# Altium footprint library PCB_ConnectorHDR.PcbLib: 221 footprints (part 12 of 14)
Each footprint in its own frame and in the unit in brackets; x right, y up, seen from the top. Pads: shape width x height; smd on the part's side, far side on the other; paste and mask are expansions set on the pad; w line width, h text height; cw(c..) or ccw(c..) is an arc to the next point about the centre after c.
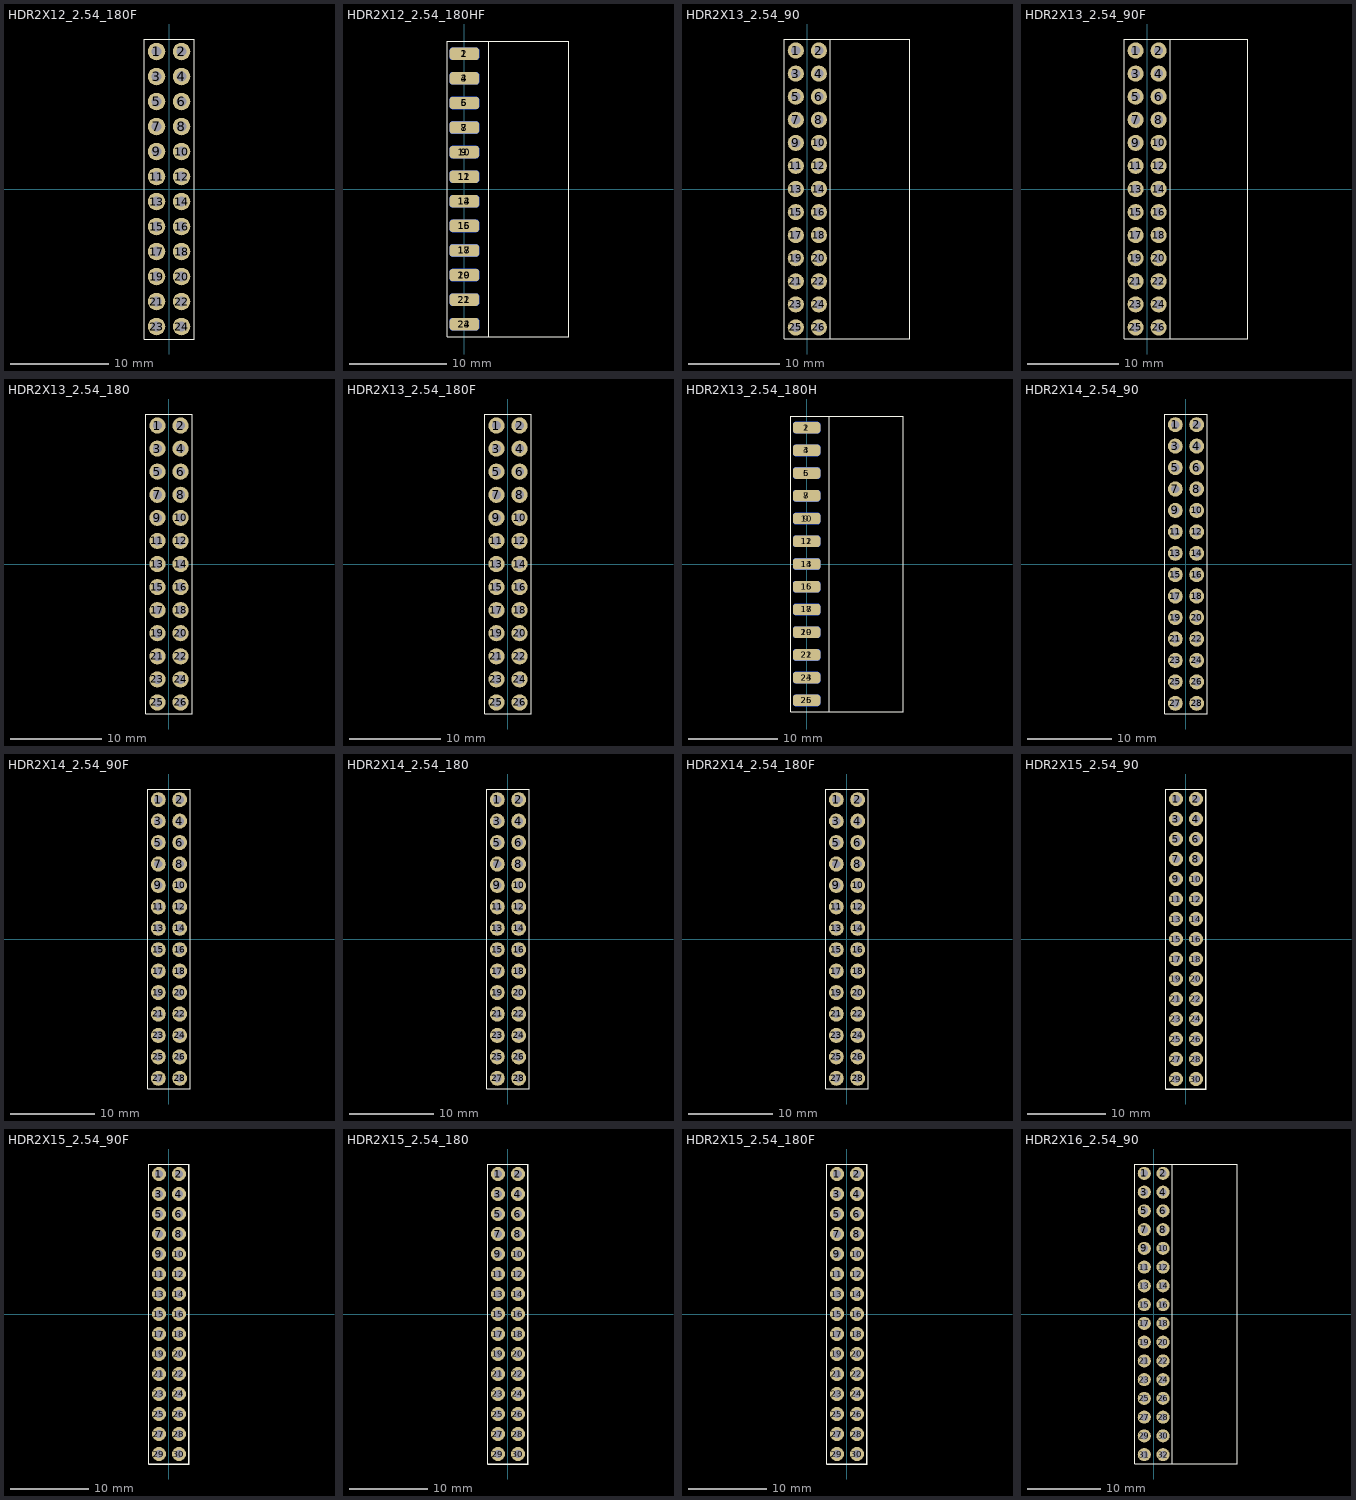
[diagram p11: the footprints below, top view; thin cyan lines are the x and y axes]

## HDR2X12_2.54_180F [mil]
height 169.29
pads (24):
  round 70 hole 39.37: 1(-50,550) 2(50,550) 3(-50,450) 4(50,450) 5(-50,350) 6(50,350) 7(-50,250) 8(50,250) 9(-50,150) 10(50,150) 11(-50,50) 12(50,50) 13(-50,-50) 14(50,-50) 15(-50,-150) 16(50,-150) 17(-50,-250) 18(50,-250) 19(-50,-350) 20(50,-350) 21(-50,-450) 22(50,-450) 23(-50,-550) 24(50,-550)
Top Overlay:
  lines w2: -100,-600 -100,600 ; -100,-600 100,-600 ; -100,-600 100,-600 ; -100,-600 -100,600 ; -100,600 100,600 ; -100,600 100,600 ; 100,-600 100,600 ; 100,-600 100,600
3D body "female_header_a-bl254-dg-g24d.stp": height 334.65, standoff -125.98, extent -98.43,-604.92 98.42,604.92

## HDR2X12_2.54_180HF [mil]
height 169.29
pads (24):
  rrect50% 120x50 smd: 1(0,550) 3(0,450) 5(0,350) 7(0,250) 9(0,150) 11(0,50) 13(0,-50) 15(0,-150) 17(0,-250) 19(0,-350) 21(0,-450) 23(0,-550)
  rrect50% 120x50 smd far side: 2(0,550) 4(0,450) 6(0,350) 8(0,250) 10(0,150) 12(0,50) 14(0,-50) 16(0,-150) 18(0,-250) 20(0,-350) 22(0,-450) 24(0,-550)
Top Overlay:
  lines w2: -70,-600 -70,600 ; -70,-600 100,-600 ; -70,-600 425,-600 425,600 -70,600 ; -70,-600 -70,600 ; -70,-600 100,-600 ; -70,-600 -70,600 ; -70,600 100,600 ; -70,600 100,600 ; 100,-600 100,600 ; 100,-600 100,600
3D body "female_header_a-bl254-dg-g24d.stp": height 88.43, standoff -108.43, extent -35.98,-604.92 424.65,604.92

## HDR2X13_2.54_90 [mil]
height 169.29
pads (26):
  round 70 hole 39.37: 1(-50,600) 2(50,600) 3(-50,500) 4(50,500) 5(-50,400) 6(50,400) 7(-50,300) 8(50,300) 9(-50,200) 10(50,200) 11(-50,100) 12(50,100) 13(-50,0) 14(50,0) 15(-50,-100) 16(50,-100) 17(-50,-200) 18(50,-200) 19(-50,-300) 20(50,-300) 21(-50,-400) 22(50,-400) 23(-50,-500) 24(50,-500) 25(-50,-600) 26(50,-600)
Top Overlay:
  lines w2: -100,-650 -100,650 ; -100,-650 444,-650 444,650 -100,650 ; -100,-650 -100,650 ; -100,-650 100,-650 100,650 -100,650
3D body "pin_header_awl254-da-g26d.stp": height 98.43, standoff -216.54, extent -62,-650 445.09,650

## HDR2X13_2.54_90F [mil]
height 169.29
pads (26):
  round 70 hole 39.37: 1(-50,600) 2(50,600) 3(-50,500) 4(50,500) 5(-50,400) 6(50,400) 7(-50,300) 8(50,300) 9(-50,200) 10(50,200) 11(-50,100) 12(50,100) 13(-50,0) 14(50,0) 15(-50,-100) 16(50,-100) 17(-50,-200) 18(50,-200) 19(-50,-300) 20(50,-300) 21(-50,-400) 22(50,-400) 23(-50,-500) 24(50,-500) 25(-50,-600) 26(50,-600)
Top Overlay:
  lines w2: -100,-650 -100,650 ; -100,-650 437,-650 437,650 -100,650 ; -100,-650 -100,650 ; -100,-650 100,-650 100,650 -100,650
3D body "female_header_A-BL254-DA-G26D.stp": height 197.35, standoff -125.48, extent -58,-654.84 438.06,655

## HDR2X13_2.54_180 [mil]
height 169.29
pads (26):
  round 70 hole 39.37: 1(-50,600) 2(50,600) 3(-50,500) 4(50,500) 5(-50,400) 6(50,400) 7(-50,300) 8(50,300) 9(-50,200) 10(50,200) 11(-50,100) 12(50,100) 13(-50,0) 14(50,0) 15(-50,-100) 16(50,-100) 17(-50,-200) 18(50,-200) 19(-50,-300) 20(50,-300) 21(-50,-400) 22(50,-400) 23(-50,-500) 24(50,-500) 25(-50,-600) 26(50,-600)
Top Overlay:
  lines w2: -100,-650 100,-650 ; -100,-650 -100,650 ; -100,-650 100,-650 ; -100,-650 -100,650 ; -100,650 100,650 ; -100,650 100,650 ; 100,-650 100,650 ; 100,-650 100,650
3D body "User Library-PLD-26.step": height 330.71, standoff -118.11, extent -98.42,-650 98.43,650

## HDR2X13_2.54_180F [mil]
height 169.29
pads (26):
  round 70 hole 39.37: 1(-50,600) 2(50,600) 3(-50,500) 4(50,500) 5(-50,400) 6(50,400) 7(-50,300) 8(50,300) 9(-50,200) 10(50,200) 11(-50,100) 12(50,100) 13(-50,0) 14(50,0) 15(-50,-100) 16(50,-100) 17(-50,-200) 18(50,-200) 19(-50,-300) 20(50,-300) 21(-50,-400) 22(50,-400) 23(-50,-500) 24(50,-500) 25(-50,-600) 26(50,-600)
Top Overlay:
  lines w2: -100,-650 100,-650 ; -100,-650 -100,650 ; -100,-650 100,-650 ; -100,-650 -100,650 ; -100,650 100,650 ; -100,650 100,650 ; 100,-650 100,650 ; 100,-650 100,650
3D body "female_header_a-bl254-dg-g26d.stp": height 334.65, standoff -125.98, extent -98.42,-654.92 98.43,654.92

## HDR2X13_2.54_180H [mil]
height 169.29
pads (26):
  rrect50% 120x50 smd: 1(0,600) 3(0,500) 5(0,400) 7(0,300) 9(0,200) 11(0,100) 13(0,0) 15(0,-100) 17(0,-200) 19(0,-300) 21(0,-400) 23(0,-500) 25(0,-600)
  rrect50% 120x50 smd far side: 2(0,600) 4(0,500) 6(0,400) 8(0,300) 10(0,200) 12(0,100) 14(0,0) 16(0,-100) 18(0,-200) 20(0,-300) 22(0,-400) 24(0,-500) 26(0,-600)
Top Overlay:
  lines w2: -70,-650 100,-650 ; -70,-650 -70,650 ; -70,-650 425,-650 425,650 -70,650 ; -70,-650 -70,650 ; -70,-650 100,-650 ; -70,-650 -70,650 ; -70,650 100,650 ; -70,650 100,650 ; 100,-650 100,650 ; 100,-650 100,650
3D body "pin_header_awl254-dg-g26d.stp": height 100, standoff -100, extent -36.38,-650 416.38,650

## HDR2X14_2.54_90 [mil]
height 169.29
pads (28):
  round 70 hole 39.37: 1(-50,650) 2(50,650) 3(-50,550) 4(50,550) 5(-50,450) 6(50,450) 7(-50,350) 8(50,350) 9(-50,250) 10(50,250) 11(-50,150) 12(50,150) 13(-50,50) 14(50,50) 15(-50,-50) 16(50,-50) 17(-50,-150) 18(50,-150) 19(-50,-250) 20(50,-250) 21(-50,-350) 22(50,-350) 23(-50,-450) 24(50,-450) 25(-50,-550) 26(50,-550) 27(-50,-650) 28(50,-650)
Top Overlay:
  lines w2: -100,-700 100,-700 ; -100,-700 -100,700 ; -100,-700 100,-700 ; -100,-700 -100,700 ; -100,700 100,700 ; -100,700 100,700 ; 100,-700 100,700 ; 100,-700 100,700
3D body "pin_header_awl254-da-g28d.stp": height 197.35, standoff -117.61, extent -63,-700 444.09,700

## HDR2X14_2.54_90F [mil]
height 169.29
pads (28):
  round 70 hole 39.37: 1(-50,650) 2(50,650) 3(-50,550) 4(50,550) 5(-50,450) 6(50,450) 7(-50,350) 8(50,350) 9(-50,250) 10(50,250) 11(-50,150) 12(50,150) 13(-50,50) 14(50,50) 15(-50,-50) 16(50,-50) 17(-50,-150) 18(50,-150) 19(-50,-250) 20(50,-250) 21(-50,-350) 22(50,-350) 23(-50,-450) 24(50,-450) 25(-50,-550) 26(50,-550) 27(-50,-650) 28(50,-650)
Top Overlay:
  lines w2: -100,-700 -100,700 ; -100,-700 100,-700 ; -100,-700 -100,700 ; -100,-700 100,-700 ; -100,700 100,700 ; -100,700 100,700 ; 100,-700 100,700 ; 100,-700 100,700
3D body "female_header_a-bl254-da-g28d.stp": height 197.35, standoff -125.48, extent -60,-704.84 436.06,705

## HDR2X14_2.54_180 [mil]
height 169.29
pads (28):
  round 70 hole 39.37: 1(-50,650) 2(50,650) 3(-50,550) 4(50,550) 5(-50,450) 6(50,450) 7(-50,350) 8(50,350) 9(-50,250) 10(50,250) 11(-50,150) 12(50,150) 13(-50,50) 14(50,50) 15(-50,-50) 16(50,-50) 17(-50,-150) 18(50,-150) 19(-50,-250) 20(50,-250) 21(-50,-350) 22(50,-350) 23(-50,-450) 24(50,-450) 25(-50,-550) 26(50,-550) 27(-50,-650) 28(50,-650)
Top Overlay:
  lines w2: -100,-700 -100,700 ; -100,-700 100,-700 ; -100,-700 -100,700 ; -100,-700 100,-700 ; -100,700 100,700 ; -100,700 100,700 ; 100,-700 100,700 ; 100,-700 100,700
3D body "User Library-PLD-28.step": height 330.71, standoff -118.11, extent -98.42,-700 98.43,700

## HDR2X14_2.54_180F [mil]
height 169.29
pads (28):
  round 70 hole 39.37: 1(-50,650) 2(50,650) 3(-50,550) 4(50,550) 5(-50,450) 6(50,450) 7(-50,350) 8(50,350) 9(-50,250) 10(50,250) 11(-50,150) 12(50,150) 13(-50,50) 14(50,50) 15(-50,-50) 16(50,-50) 17(-50,-150) 18(50,-150) 19(-50,-250) 20(50,-250) 21(-50,-350) 22(50,-350) 23(-50,-450) 24(50,-450) 25(-50,-550) 26(50,-550) 27(-50,-650) 28(50,-650)
Top Overlay:
  lines w2: -100,-700 -100,700 ; -100,-700 100,-700 ; -100,-700 -100,700 ; -100,-700 100,-700 ; -100,700 100,700 ; -100,700 100,700 ; 100,-700 100,700 ; 100,-700 100,700
3D body "female_header_a-bl254-dg-g28d.stp": height 334.65, standoff -125.98, extent -98,-704.84 98.85,705

## HDR2X15_2.54_90 [mil]
height 169.29
pads (30):
  round 70 hole 39.37: 1(-50,700) 2(50,700) 3(-50,600) 4(50,600) 5(-50,500) 6(50,500) 7(-50,400) 8(50,400) 9(-50,300) 10(50,300) 11(-50,200) 12(50,200) 13(-50,100) 14(50,100) 15(-50,0) 16(50,0) 17(-50,-100) 18(50,-100) 19(-50,-200) 20(50,-200) 21(-50,-300) 22(50,-300) 23(-50,-400) 24(50,-400) 25(-50,-500) 26(50,-500) 27(-50,-600) 28(50,-600) 29(-50,-700) 30(50,-700)
Top Overlay:
  lines w2: -100,-750 100,-750 ; -100,-750 -100,750 ; -100,-750 100,-750 ; -100,-750 -100,750 ; -100,750 100,750 ; -100,750 100,750 ; 100,-750 100,750 ; 100,-750 100,750
3D body "pin_header_awl254-da-g30d.stp": height 197.35, standoff -117.61, extent -63,-750 444.09,750

## HDR2X15_2.54_90F [mil]
height 169.29
pads (30):
  round 70 hole 39.37: 1(-50,700) 2(50,700) 3(-50,600) 4(50,600) 5(-50,500) 6(50,500) 7(-50,400) 8(50,400) 9(-50,300) 10(50,300) 11(-50,200) 12(50,200) 13(-50,100) 14(50,100) 15(-50,0) 16(50,0) 17(-50,-100) 18(50,-100) 19(-50,-200) 20(50,-200) 21(-50,-300) 22(50,-300) 23(-50,-400) 24(50,-400) 25(-50,-500) 26(50,-500) 27(-50,-600) 28(50,-600) 29(-50,-700) 30(50,-700)
Top Overlay:
  lines w2: -100,-750 -100,750 ; -100,-750 100,-750 ; -100,-750 -100,750 ; -100,-750 100,-750 ; -100,750 100,750 ; -100,750 100,750 ; 100,-750 100,750 ; 100,-750 100,750
3D body "female_header_a-bl254-da-g30d.stp": height 197.35, standoff -125.48, extent -60,-754.84 436.06,755

## HDR2X15_2.54_180 [mil]
height 169.29
pads (30):
  round 70 hole 39.37: 1(-50,700) 2(50,700) 3(-50,600) 4(50,600) 5(-50,500) 6(50,500) 7(-50,400) 8(50,400) 9(-50,300) 10(50,300) 11(-50,200) 12(50,200) 13(-50,100) 14(50,100) 15(-50,0) 16(50,0) 17(-50,-100) 18(50,-100) 19(-50,-200) 20(50,-200) 21(-50,-300) 22(50,-300) 23(-50,-400) 24(50,-400) 25(-50,-500) 26(50,-500) 27(-50,-600) 28(50,-600) 29(-50,-700) 30(50,-700)
Top Overlay:
  lines w2: -100,-750 100,-750 ; -100,-750 -100,750 ; -100,-750 100,-750 ; -100,-750 -100,750 ; -100,750 100,750 ; -100,750 100,750 ; 100,-750 100,750 ; 100,-750 100,750
3D body "User Library-PLD-30.step": height 330.71, standoff -118.11, extent -98.42,-750 98.43,750

## HDR2X15_2.54_180F [mil]
height 169.29
pads (30):
  round 70 hole 39.37: 1(-50,700) 2(50,700) 3(-50,600) 4(50,600) 5(-50,500) 6(50,500) 7(-50,400) 8(50,400) 9(-50,300) 10(50,300) 11(-50,200) 12(50,200) 13(-50,100) 14(50,100) 15(-50,0) 16(50,0) 17(-50,-100) 18(50,-100) 19(-50,-200) 20(50,-200) 21(-50,-300) 22(50,-300) 23(-50,-400) 24(50,-400) 25(-50,-500) 26(50,-500) 27(-50,-600) 28(50,-600) 29(-50,-700) 30(50,-700)
Top Overlay:
  lines w2: -100,-750 100,-750 ; -100,-750 -100,750 ; -100,-750 100,-750 ; -100,-750 -100,750 ; -100,750 100,750 ; -100,750 100,750 ; 100,-750 100,750 ; 100,-750 100,750
3D body "female_header_a-bl254-dg-g30d.stp": height 334.65, standoff -125.98, extent -98,-754.84 98.85,755

## HDR2X16_2.54_90 [mil]
height 169.29
pads (32):
  round 70 hole 39.37: 1(-50,750) 2(50,750) 3(-50,650) 4(50,650) 5(-50,550) 6(50,550) 7(-50,450) 8(50,450) 9(-50,350) 10(50,350) 11(-50,250) 12(50,250) 13(-50,150) 14(50,150) 15(-50,50) 16(50,50) 17(-50,-50) 18(50,-50) 19(-50,-150) 20(50,-150) 21(-50,-250) 22(50,-250) 23(-50,-350) 24(50,-350) 25(-50,-450) 26(50,-450) 27(-50,-550) 28(50,-550) 29(-50,-650) 30(50,-650) 31(-50,-750) 32(50,-750)
Top Overlay:
  lines w2: -100,-800 100,-800 100,800 -100,800 ; -100,-800 -100,800 ; -100,-800 445,-800 445,800 -100,800 ; -100,-800 -100,800
3D body "pin_header_awl254-da-g32d.stp": height 197.35, standoff -117.61, extent -63,-800 444.09,800